# Altium schematic symbol library Capacitor - Aluminium TH.SchLib: 4591 symbols (part 15 of 27) (continued)
## UBX1H471MHL1TO (continued)
CAP ALUM 470UF 20% 50V RADIAL; Part Number: UBX1H471MHL1TO; Manufacturer: Nichicon; TemperatureRange: -55C ~ 150C; Type: Polar; Ripple Current: 960mA; Value: 470uF; PartId: 23783; Supplier 1: Digi-Key; Supplier Part Number 1: 493-13204-1-ND; ComponentLink1Description: Datasheet; ComponentLink1URL: http://nichicon-us.com/english/products/pdfs/e-ubx.pdf; ComponentLink2Description: Digi-Key Listing; ComponentLink2URL: https://www.digikey.com/product-detail/en/nichicon/UBX1H471MHL1TO/493-13204-1-ND/4333214; Tolerance: 20%; Voltage: 50V; Price: 3.25; Device Package: Radial, Can, 12.5mm
footprint CAP AL TH D12.5 L5 H26.5
pins: 1, 2

## UBX1J221MHL1TO
designator C?, comment 220uF  (value not drawn)
CAP ALUM 220UF 20% 63V RADIAL; Part Number: UBX1J221MHL1TO; Manufacturer: Nichicon; TemperatureRange: -55C ~ 150C; Type: Polar; Ripple Current: 520mA @ 120Hz; Value: 220uF; PartId: 23728; Supplier 1: Digi-Key; Supplier Part Number 1: 493-13207-3-ND; ComponentLink1Description: Datasheet; ComponentLink1URL: http://nichicon-us.com/english/products/pdfs/e-ubx.pdf; ComponentLink2Description: Digi-Key Listing; ComponentLink2URL: https://www.digikey.com/product-detail/en/nichicon/UBX1J221MHL1TO/493-13207-3-ND/4332838; Tolerance: 20%; Voltage: 63V; Price: 1.3638; Device Package: Radial, Can, 12.5mm
footprint CAP AL TH D12.5 L5 H26.5
pins: 1, 2

## UBX1J331MHL
designator C?, comment 330uF  (value not drawn)
CAP ALUM 330UF 20% 63V RADIAL; Part Number: UBX1J331MHL; Manufacturer: Nichicon; TemperatureRange: -55C ~ 150C; Type: Polar; Ripple Current: 585mA @ 120Hz; Value: 330uF; PartId: 24429; Supplier 1: Digi-Key; Supplier Part Number 1: 493-13055-ND; ComponentLink1Description: Datasheet; ComponentLink1URL: http://nichicon-us.com/english/products/pdfs/e-ubx.pdf; ComponentLink2Description: Digi-Key Listing; ComponentLink2URL: https://www.digikey.com/product-detail/en/nichicon/UBX1J331MHL/493-13055-ND/2597555; Tolerance: 20%; Voltage: 63V; Price: 3.04; Device Package: Radial, Can, 12.5mm
footprint CAP AL TH D12.5 L5 H35.5
pins: 1, 2

## UBX1J561MHL
designator C?, comment 560uF  (value not drawn)
CAP ALUM 560UF 20% 63V RADIAL; Part Number: UBX1J561MHL; Manufacturer: Nichicon; TemperatureRange: -55C ~ 150C; Type: Polar; Ripple Current: 760mA @ 120Hz; Value: 560uF; PartId: 27308; Supplier 1: Digi-Key; Supplier Part Number 1: 493-13056-ND; ComponentLink1Description: Datasheet; ComponentLink1URL: http://nichicon-us.com/english/products/pdfs/e-ubx.pdf; ComponentLink2Description: Digi-Key Listing; ComponentLink2URL: https://www.digikey.com/product-detail/en/nichicon/UBX1J561MHL/493-13056-ND/2597558; Tolerance: 20%; Voltage: 63V; Price: 4.24; Device Package: Radial, Can, 16mm
footprint CAP AL TH D16 L7.5 H33.5
pins: 1, 2

## UBX1J681MHL
designator C?, comment 680uF  (value not drawn)
CAP ALUM 680UF 20% 63V RADIAL; Part Number: UBX1J681MHL; Manufacturer: Nichicon; TemperatureRange: -55C ~ 150C; Type: Polar; Ripple Current: 760mA @ 120Hz; Value: 680uF; PartId: 27450; Supplier 1: Digi-Key; Supplier Part Number 1: 493-13057-ND; ComponentLink1Description: Datasheet; ComponentLink1URL: http://nichicon-us.com/english/products/pdfs/e-ubx.pdf; ComponentLink2Description: Digi-Key Listing; ComponentLink2URL: https://www.digikey.com/product-detail/en/nichicon/UBX1J681MHL/493-13057-ND/2597560; Tolerance: 20%; Voltage: 63V; Price: 4.45; Device Package: Radial, Can, 16mm
footprint CAP AL TH D16 L7.5 H37
pins: 1, 2

## UBX1K101MHL1TO
designator C?, comment 100uF  (value not drawn)
CAP ALUM 100UF 20% 80V RADIAL; Part Number: UBX1K101MHL1TO; Manufacturer: Nichicon; TemperatureRange: -55C ~ 150C; Type: Polar; Ripple Current: 820mA; Value: 100uF; PartId: 23086; Supplier 1: Digi-Key; Supplier Part Number 1: 493-13211-1-ND; ComponentLink1Description: Datasheet; ComponentLink1URL: http://nichicon-us.com/english/products/pdfs/e-ubx.pdf; ComponentLink2Description: Digi-Key Listing; ComponentLink2URL: https://www.digikey.com/product-detail/en/nichicon/UBX1K101MHL1TO/493-13211-1-ND/4333221; Tolerance: 20%; Voltage: 80V; Price: 0; Device Package: Radial, Can, 12.5mm
footprint CAP AL TH D12.5 L5 H21.5
pins: 1, 2

## UBX1K331MHL
designator C?, comment 330uF  (value not drawn)
CAP ALUM 330UF 20% 80V RADIAL; Part Number: UBX1K331MHL; Manufacturer: Nichicon; TemperatureRange: -55C ~ 150C; Type: Polar; Ripple Current: 740mA @ 120Hz; Value: 330uF; PartId: 27310; Supplier 1: Digi-Key; Supplier Part Number 1: 493-13058-ND; ComponentLink1Description: Datasheet; ComponentLink1URL: http://nichicon-us.com/english/products/pdfs/e-ubx.pdf; ComponentLink2Description: Digi-Key Listing; ComponentLink2URL: https://www.digikey.com/product-detail/en/nichicon/UBX1K331MHL/493-13058-ND/2597564; Tolerance: 20%; Voltage: 80V; Price: 4.32; Device Package: Radial, Can, 16mm
footprint CAP AL TH D16 L7.5 H33.5
pins: 1, 2

## UBX1V2R2MPL1TD
designator C?, comment 2.2uF  (value not drawn)
CAP ALUM 2.2UF 20% 35V RADIAL; Part Number: UBX1V2R2MPL1TD; Manufacturer: Nichicon; TemperatureRange: -55C ~ 150C; Type: Polar; Ripple Current: 25mA @ 120Hz; Value: 2.2uF; PartId: 24740; Supplier 1: Digi-Key; Supplier Part Number 1: 493-13222-3-ND; ComponentLink1Description: Datasheet; ComponentLink1URL: http://nichicon-us.com/english/products/pdfs/e-ubx.pdf; ComponentLink2Description: Digi-Key Listing; ComponentLink2URL: https://www.digikey.com/product-detail/en/nichicon/UBX1V2R2MPL1TD/493-13222-3-ND/4332853; Tolerance: 20%; Voltage: 35V; Price: 0.419; Device Package: Radial, Can, 10mm
footprint CAP AL TH D10 L5 H14.5
pins: 1, 2

## UBX1V101MPL1TD
designator C?, comment 100uF  (value not drawn)
CAP ALUM 100UF 20% 35V RADIAL; Part Number: UBX1V101MPL1TD; Manufacturer: Nichicon; TemperatureRange: -55C ~ 150C; Type: Polar; Ripple Current: 200mA @ 120Hz; Value: 100uF; PartId: 25502; Supplier 1: Digi-Key; Supplier Part Number 1: 493-13219-3-ND; ComponentLink1Description: Datasheet; ComponentLink1URL: http://nichicon-us.com/english/products/pdfs/e-ubx.pdf; ComponentLink2Description: Digi-Key Listing; ComponentLink2URL: https://www.digikey.com/product-detail/en/nichicon/UBX1V101MPL1TD/493-13219-3-ND/4332850; Tolerance: 20%; Voltage: 35V; Price: 0.4773; Device Package: Radial, Can, 10mm
footprint CAP AL TH D10 L5 H22
pins: 1, 2

## UBX1V220MPL1TD
designator C?, comment 22uF  (value not drawn)
CAP ALUM 22UF 20% 35V RADIAL; Part Number: UBX1V220MPL1TD; Manufacturer: Nichicon; TemperatureRange: -55C ~ 150C; Type: Polar; Ripple Current: 100mA @ 120Hz; Value: 22uF; PartId: 24741; Supplier 1: Digi-Key; Supplier Part Number 1: 493-13220-3-ND; ComponentLink1Description: Datasheet; ComponentLink1URL: http://nichicon-us.com/english/products/pdfs/e-ubx.pdf; ComponentLink2Description: Digi-Key Listing; ComponentLink2URL: https://www.digikey.com/product-detail/en/nichicon/UBX1V220MPL1TD/493-13220-3-ND/4332851; Tolerance: 20%; Voltage: 35V; Price: 0.419; Device Package: Radial, Can, 10mm
footprint CAP AL TH D10 L5 H14.5
pins: 1, 2

## UBX1V221MHL1TO
designator C?, comment 220uF  (value not drawn)
CAP ALUM 220UF 20% 35V RADIAL; Part Number: UBX1V221MHL1TO; Manufacturer: Nichicon; TemperatureRange: -55C ~ 150C; Type: Polar; Ripple Current: 600mA; Value: 220uF; PartId: 23761; Supplier 1: Digi-Key; Supplier Part Number 1: 493-13221-1-ND; ComponentLink1Description: Datasheet; ComponentLink1URL: http://nichicon-us.com/english/products/pdfs/e-ubx.pdf; ComponentLink2Description: Digi-Key Listing; ComponentLink2URL: https://www.digikey.com/product-detail/en/nichicon/UBX1V221MHL1TO/493-13221-1-ND/4333231; Tolerance: 20%; Voltage: 35V; Price: 1.77; Device Package: Radial, Can, 12.5mm
footprint CAP AL TH D12.5 L5 H26.5
pins: 1, 2

## UBX1V330MPL1TD
designator C?, comment 33uF  (value not drawn)
CAP ALUM 33UF 20% 35V RADIAL; Part Number: UBX1V330MPL1TD; Manufacturer: Nichicon; TemperatureRange: -55C ~ 150C; Type: Polar; Ripple Current: 112.5mA @ 120Hz; Value: 33uF; PartId: 24755; Supplier 1: Digi-Key; Supplier Part Number 1: 493-13223-3-ND; ComponentLink1Description: Datasheet; ComponentLink1URL: http://nichicon-us.com/english/products/pdfs/e-ubx.pdf; ComponentLink2Description: Digi-Key Listing; ComponentLink2URL: https://www.digikey.com/product-detail/en/nichicon/UBX1V330MPL1TD/493-13223-3-ND/4332854; Tolerance: 20%; Voltage: 35V; Price: 0.4244; Device Package: Radial, Can, 10mm
footprint CAP AL TH D10 L5 H14.5
pins: 1, 2

## UBX1V471MHL
designator C?, comment 470uF  (value not drawn)
CAP ALUM 470UF 20% 35V RADIAL; Part Number: UBX1V471MHL; Manufacturer: Nichicon; TemperatureRange: -55C ~ 150C; Type: Polar; Ripple Current: 500mA @ 120Hz; Value: 470uF; PartId: 27263; Supplier 1: Digi-Key; Supplier Part Number 1: 493-13061-ND; ComponentLink1Description: Datasheet; ComponentLink1URL: http://nichicon-us.com/english/products/pdfs/e-ubx.pdf; ComponentLink2Description: Digi-Key Listing; ComponentLink2URL: https://www.digikey.com/product-detail/en/nichicon/UBX1V471MHL/493-13061-ND/2597580; Tolerance: 20%; Voltage: 35V; Price: 2.86; Device Package: Radial, Can, 16mm
footprint CAP AL TH D16 L7.5 H33.5
pins: 1, 2

## UBX2A101MHL1TO
designator C?, comment 100uF  (value not drawn)
CAP ALUM 100UF 20% 100V RADIAL; Part Number: UBX2A101MHL1TO; Manufacturer: Nichicon; TemperatureRange: -55C ~ 150C; Type: Polar; Ripple Current: 475mA @ 120Hz; Value: 100uF; PartId: 23731; Supplier 1: Digi-Key; Supplier Part Number 1: 493-13228-3-ND; ComponentLink1Description: Datasheet; ComponentLink1URL: http://nichicon-us.com/english/products/pdfs/e-ubx.pdf; ComponentLink2Description: Digi-Key Listing; ComponentLink2URL: https://www.digikey.com/product-detail/en/nichicon/UBX2A101MHL1TO/493-13228-3-ND/4332859; Tolerance: 20%; Voltage: 100V; Price: 1.4289; Device Package: Radial, Can, 12.5mm
footprint CAP AL TH D12.5 L5 H26.5
pins: 1, 2

## UBX2A221MHL
designator C?, comment 220uF  (value not drawn)
CAP ALUM 220UF 20% 100V RADIAL; Part Number: UBX2A221MHL; Manufacturer: Nichicon; TemperatureRange: -55C ~ 150C; Type: Polar; Ripple Current: 690mA @ 120Hz; Value: 220uF; PartId: 27309; Supplier 1: Digi-Key; Supplier Part Number 1: 493-13062-ND; ComponentLink1Description: Datasheet; ComponentLink1URL: http://nichicon-us.com/english/products/pdfs/e-ubx.pdf; ComponentLink2Description: Digi-Key Listing; ComponentLink2URL: https://www.digikey.com/product-detail/en/nichicon/UBX2A221MHL/493-13062-ND/2597584; Tolerance: 20%; Voltage: 100V; Price: 4.32; Device Package: Radial, Can, 16mm
footprint CAP AL TH D16 L7.5 H33.5
pins: 1, 2

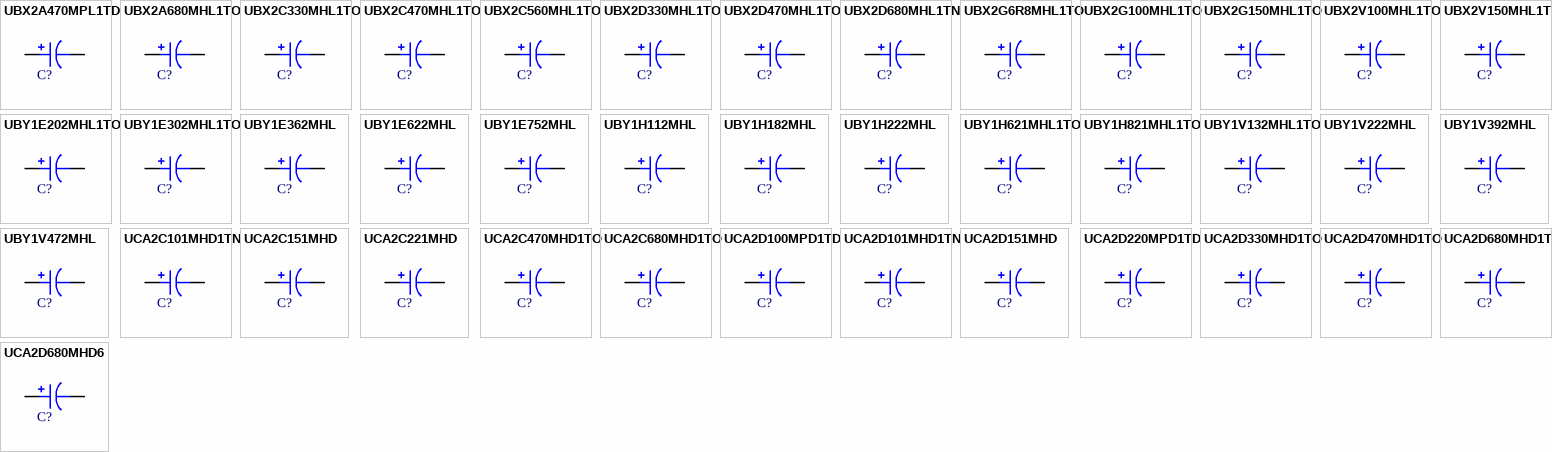
[diagram p61: symbols UBX2A470MPL1TD to UCA2D680MHD6]

## UBX2A470MPL1TD
designator C?, comment 47uF  (value not drawn)
CAP ALUM 47UF 20% 100V RADIAL; Part Number: UBX2A470MPL1TD; Manufacturer: Nichicon; TemperatureRange: -55C ~ 150C; Type: Polar; Ripple Current: 320mA @ 120Hz; Value: 47uF; PartId: 25688; Supplier 1: Digi-Key; Supplier Part Number 1: 493-13096-3-ND; ComponentLink1Description: Datasheet; ComponentLink1URL: http://nichicon-us.com/english/products/pdfs/e-ubx.pdf; ComponentLink2Description: Digi-Key Listing; ComponentLink2URL: https://www.digikey.com/product-detail/en/nichicon/UBX2A470MPL1TD/493-13096-3-ND/4332727; Tolerance: 20%; Voltage: 100V; Price: 0.802; Device Package: Radial, Can, 10mm
footprint CAP AL TH D10 L5 H22
pins: 1, 2

## UBX2A680MHL1TO
designator C?, comment 68uF  (value not drawn)
CAP ALUM 68UF 20% 100V RADIAL; Part Number: UBX2A680MHL1TO; Manufacturer: Nichicon; TemperatureRange: -55C ~ 150C; Type: Polar; Ripple Current: 760mA; Value: 68uF; PartId: 23085; Supplier 1: Digi-Key; Supplier Part Number 1: 493-13232-1-ND; ComponentLink1Description: Datasheet; ComponentLink1URL: http://nichicon-us.com/english/products/pdfs/e-ubx.pdf; ComponentLink2Description: Digi-Key Listing; ComponentLink2URL: https://www.digikey.com/product-detail/en/nichicon/UBX2A680MHL1TO/493-13232-1-ND/4333242; Tolerance: 20%; Voltage: 100V; Price: 0; Device Package: Radial, Can, 12.5mm
footprint CAP AL TH D12.5 L5 H21.5
pins: 1, 2

## UBX2C330MHL1TO
designator C?, comment 33uF  (value not drawn)
CAP ALUM 33UF 20% 160V RADIAL; Part Number: UBX2C330MHL1TO; Manufacturer: Nichicon; TemperatureRange: -40C ~ 150C; Type: Polar; Ripple Current: 230mA; Value: 33uF; PartId: 23077; Supplier 1: Digi-Key; Supplier Part Number 1: 493-13237-1-ND; ComponentLink1Description: Datasheet; ComponentLink1URL: http://nichicon-us.com/english/products/pdfs/e-ubx.pdf; ComponentLink2Description: Digi-Key Listing; ComponentLink2URL: https://www.digikey.com/product-detail/en/nichicon/UBX2C330MHL1TO/493-13237-1-ND/4333247; Tolerance: 20%; Voltage: 160V; Price: 0; Device Package: Radial, Can, 12.5mm
footprint CAP AL TH D12.5 L5 H21.5
pins: 1, 2

## UBX2C470MHL1TO
designator C?, comment 47uF  (value not drawn)
CAP ALUM 47UF 20% 160V RADIAL; Part Number: UBX2C470MHL1TO; Manufacturer: Nichicon; TemperatureRange: -40C ~ 150C; Type: Polar; Ripple Current: 250mA; Value: 47uF; PartId: 23083; Supplier 1: Digi-Key; Supplier Part Number 1: 493-13238-1-ND; ComponentLink1Description: Datasheet; ComponentLink1URL: http://nichicon-us.com/english/products/pdfs/e-ubx.pdf; ComponentLink2Description: Digi-Key Listing; ComponentLink2URL: https://www.digikey.com/product-detail/en/nichicon/UBX2C470MHL1TO/493-13238-1-ND/4333248; Tolerance: 20%; Voltage: 160V; Price: 0; Device Package: Radial, Can, 12.5mm
footprint CAP AL TH D12.5 L5 H21.5
pins: 1, 2

## UBX2C560MHL1TO
designator C?, comment 56uF  (value not drawn)
CAP ALUM 56UF 20% 160V RADIAL; Part Number: UBX2C560MHL1TO; Manufacturer: Nichicon; TemperatureRange: -40C ~ 150C; Type: Polar; Ripple Current: 270mA; Value: 56uF; PartId: 23784; Supplier 1: Digi-Key; Supplier Part Number 1: 493-13239-1-ND; ComponentLink1Description: Datasheet; ComponentLink1URL: http://nichicon-us.com/english/products/pdfs/e-ubx.pdf; ComponentLink2Description: Digi-Key Listing; ComponentLink2URL: https://www.digikey.com/product-detail/en/nichicon/UBX2C560MHL1TO/493-13239-1-ND/4333249; Tolerance: 20%; Voltage: 160V; Price: 3.31; Device Package: Radial, Can, 12.5mm
footprint CAP AL TH D12.5 L5 H26.5
pins: 1, 2

## UBX2D330MHL1TO
designator C?, comment 33uF  (value not drawn)
CAP ALUM 33UF 20% 200V RADIAL; Part Number: UBX2D330MHL1TO; Manufacturer: Nichicon; TemperatureRange: -40C ~ 150C; Type: Polar; Ripple Current: 210mA; Value: 33uF; PartId: 23082; Supplier 1: Digi-Key; Supplier Part Number 1: 493-13244-1-ND; ComponentLink1Description: Datasheet; ComponentLink1URL: http://nichicon-us.com/english/products/pdfs/e-ubx.pdf; ComponentLink2Description: Digi-Key Listing; ComponentLink2URL: https://www.digikey.com/product-detail/en/nichicon/UBX2D330MHL1TO/493-13244-1-ND/4333254; Tolerance: 20%; Voltage: 200V; Price: 0; Device Package: Radial, Can, 12.5mm
footprint CAP AL TH D12.5 L5 H21.5
pins: 1, 2

## UBX2D470MHL1TO
designator C?, comment 47uF  (value not drawn)
CAP ALUM 47UF 20% 200V RADIAL; Part Number: UBX2D470MHL1TO; Manufacturer: Nichicon; TemperatureRange: -40C ~ 150C; Type: Polar; Ripple Current: 250mA; Value: 47uF; PartId: 23785; Supplier 1: Digi-Key; Supplier Part Number 1: 493-13245-1-ND; ComponentLink1Description: Datasheet; ComponentLink1URL: http://nichicon-us.com/english/products/pdfs/e-ubx.pdf; ComponentLink2Description: Digi-Key Listing; ComponentLink2URL: https://www.digikey.com/product-detail/en/nichicon/UBX2D470MHL1TO/493-13245-1-ND/4333255; Tolerance: 20%; Voltage: 200V; Price: 3.31; Device Package: Radial, Can, 12.5mm
footprint CAP AL TH D12.5 L5 H26.5
pins: 1, 2

## UBX2D680MHL1TN
designator C?, comment 68uF  (value not drawn)
CAP ALUM 68UF 20% 200V RADIAL; Part Number: UBX2D680MHL1TN; Manufacturer: Nichicon; TemperatureRange: -40C ~ 150C; Type: Polar; Ripple Current: 290mA @ 120Hz; Value: 68uF; PartId: 26711; Supplier 1: Digi-Key; Supplier Part Number 1: 493-13247-3-ND; ComponentLink1Description: Datasheet; ComponentLink1URL: http://nichicon-us.com/english/products/pdfs/e-ubx.pdf; ComponentLink2Description: Digi-Key Listing; ComponentLink2URL: https://www.digikey.com/product-detail/en/nichicon/UBX2D680MHL1TN/493-13247-3-ND/4332878; Tolerance: 20%; Voltage: 200V; Price: 2.3548; Device Package: Radial, Can, 16mm
footprint CAP AL TH D16 L7.5 H26.5
pins: 1, 2

## UBX2G6R8MHL1TO
designator C?, comment 6.8uF  (value not drawn)
CAP ALUM 6.8UF 20% 400V RADIAL; Part Number: UBX2G6R8MHL1TO; Manufacturer: Nichicon; TemperatureRange: -25C ~ 150C; Type: Polar; Ripple Current: 88mA; Value: 6.8uF; PartId: 23078; Supplier 1: Digi-Key; Supplier Part Number 1: 493-13252-1-ND; ComponentLink1Description: Datasheet; ComponentLink1URL: http://nichicon-us.com/english/products/pdfs/e-ubx.pdf; ComponentLink2Description: Digi-Key Listing; ComponentLink2URL: https://www.digikey.com/product-detail/en/nichicon/UBX2G6R8MHL1TO/493-13252-1-ND/4333262; Tolerance: 20%; Voltage: 400V; Price: 0; Device Package: Radial, Can, 12.5mm
footprint CAP AL TH D12.5 L5 H21.5
pins: 1, 2

## UBX2G100MHL1TO
designator C?, comment 10uF  (value not drawn)
CAP ALUM 10UF 20% 400V RADIAL; Part Number: UBX2G100MHL1TO; Manufacturer: Nichicon; TemperatureRange: -25C ~ 150C; Type: Polar; Ripple Current: 105mA; Value: 10uF; PartId: 23779; Supplier 1: Digi-Key; Supplier Part Number 1: 493-13249-1-ND; ComponentLink1Description: Datasheet; ComponentLink1URL: http://nichicon-us.com/english/products/pdfs/e-ubx.pdf; ComponentLink2Description: Digi-Key Listing; ComponentLink2URL: https://www.digikey.com/product-detail/en/nichicon/UBX2G100MHL1TO/493-13249-1-ND/4333259; Tolerance: 20%; Voltage: 400V; Price: 2.58; Device Package: Radial, Can, 12.5mm
footprint CAP AL TH D12.5 L5 H26.5
pins: 1, 2

## UBX2G150MHL1TO
designator C?, comment 15uF  (value not drawn)
CAP ALUM 15UF 20% 400V RADIAL; Part Number: UBX2G150MHL1TO; Manufacturer: Nichicon; TemperatureRange: -25C ~ 150C; Type: Polar; Ripple Current: 105mA; Value: 15uF; PartId: 23778; Supplier 1: Digi-Key; Supplier Part Number 1: 493-13250-1-ND; ComponentLink1Description: Datasheet; ComponentLink1URL: http://nichicon-us.com/english/products/pdfs/e-ubx.pdf; ComponentLink2Description: Digi-Key Listing; ComponentLink2URL: https://www.digikey.com/product-detail/en/nichicon/UBX2G150MHL1TO/493-13250-1-ND/4333260; Tolerance: 20%; Voltage: 400V; Price: 2.58; Device Package: Radial, Can, 12.5mm
footprint CAP AL TH D12.5 L5 H26.5
pins: 1, 2

## UBX2V100MHL1TO
designator C?, comment 10uF  (value not drawn)
CAP ALUM 10UF 20% 350V RADIAL; Part Number: UBX2V100MHL1TO; Manufacturer: Nichicon; TemperatureRange: -25C ~ 150C; Type: Polar; Ripple Current: 120mA; Value: 10uF; PartId: 23081; Supplier 1: Digi-Key; Supplier Part Number 1: 493-13253-1-ND; ComponentLink1Description: Datasheet; ComponentLink1URL: http://nichicon-us.com/english/products/pdfs/e-ubx.pdf; ComponentLink2Description: Digi-Key Listing; ComponentLink2URL: https://www.digikey.com/product-detail/en/nichicon/UBX2V100MHL1TO/493-13253-1-ND/4333263; Tolerance: 20%; Voltage: 350V; Price: 0; Device Package: Radial, Can, 12.5mm
footprint CAP AL TH D12.5 L5 H21.5
pins: 1, 2

## UBX2V150MHL1TO
designator C?, comment 15uF  (value not drawn)
CAP ALUM 15UF 20% 350V RADIAL; Part Number: UBX2V150MHL1TO; Manufacturer: Nichicon; TemperatureRange: -25C ~ 150C; Type: Polar; Ripple Current: 130mA; Value: 15uF; PartId: 23777; Supplier 1: Digi-Key; Supplier Part Number 1: 493-13254-1-ND; ComponentLink1Description: Datasheet; ComponentLink1URL: http://nichicon-us.com/english/products/pdfs/e-ubx.pdf; ComponentLink2Description: Digi-Key Listing; ComponentLink2URL: https://www.digikey.com/product-detail/en/nichicon/UBX2V150MHL1TO/493-13254-1-ND/4333264; Tolerance: 20%; Voltage: 350V; Price: 2.58; Device Package: Radial, Can, 12.5mm
footprint CAP AL TH D12.5 L5 H26.5
pins: 1, 2

## UBY1E202MHL1TO
designator C?, comment 2000uF  (value not drawn)
CAP ALUM 2000UF 20% 25V RADIAL; Part Number: UBY1E202MHL1TO; Manufacturer: Nichicon; TemperatureRange: -40C ~ 135C; Type: Polar; Ripple Current: 1.014A @ 120Hz; Value: 2000uF; PartId: 23079; Supplier 1: Digi-Key; Supplier Part Number 1: 493-14650-1-ND; ComponentLink1Description: Datasheet; ComponentLink1URL: http://nichicon-us.com/english/products/pdfs/UBY_e.pdf; ComponentLink2Description: Digi-Key Listing; ComponentLink2URL: https://www.digikey.com/product-detail/en/nichicon/UBY1E202MHL1TO/493-14650-1-ND/5818417; Tolerance: 20%; Voltage: 25V; Price: 0; Device Package: Radial, Can, 12.5mm
footprint CAP AL TH D12.5 L5 H21.5
pins: 1, 2

## UBY1E302MHL1TO
designator C?, comment 3000uF  (value not drawn)
CAP ALUM 3000UF 20% 25V RADIAL; Part Number: UBY1E302MHL1TO; Manufacturer: Nichicon; TemperatureRange: -40C ~ 135C; Type: Polar; Ripple Current: 1.508A @ 120Hz; Value: 3000uF; PartId: 23780; Supplier 1: Digi-Key; Supplier Part Number 1: 493-14651-1-ND; ComponentLink1Description: Datasheet; ComponentLink1URL: http://nichicon-us.com/english/products/pdfs/UBY_e.pdf; ComponentLink2Description: Digi-Key Listing; ComponentLink2URL: https://www.digikey.com/product-detail/en/nichicon/UBY1E302MHL1TO/493-14651-1-ND/5818418; Tolerance: 20%; Voltage: 25V; Price: 3.06; Device Package: Radial, Can, 12.5mm
footprint CAP AL TH D12.5 L5 H26.5
pins: 1, 2

## UBY1E362MHL
designator C?, comment 3600uF  (value not drawn)
CAP ALUM 3600UF 20% 25V RADIAL; Part Number: UBY1E362MHL; Manufacturer: Nichicon; TemperatureRange: -40C ~ 135C; Type: Polar; Ripple Current: 2.175A @ 120Hz; Value: 3600uF; PartId: 24431; Supplier 1: Digi-Key; Supplier Part Number 1: 493-14624-ND; ComponentLink1Description: Datasheet; ComponentLink1URL: http://nichicon-us.com/english/products/pdfs/UBY_e.pdf; ComponentLink2Description: Digi-Key Listing; ComponentLink2URL: https://www.digikey.com/product-detail/en/nichicon/UBY1E362MHL/493-14624-ND/5818373; Tolerance: 20%; Voltage: 25V; Price: 3.23; Device Package: Radial, Can, 12.5mm
footprint CAP AL TH D12.5 L5 H35.5
pins: 1, 2

## UBY1E622MHL
designator C?, comment 6200uF  (value not drawn)
CAP ALUM 6200UF 20% 25V RADIAL; Part Number: UBY1E622MHL; Manufacturer: Nichicon; TemperatureRange: -40C ~ 135C; Type: Polar; Ripple Current: 2.89A @ 120Hz; Value: 6200uF; PartId: 27305; Supplier 1: Digi-Key; Supplier Part Number 1: 493-14626-ND; ComponentLink1Description: Datasheet; ComponentLink1URL: http://nichicon-us.com/english/products/pdfs/UBY_e.pdf; ComponentLink2Description: Digi-Key Listing; ComponentLink2URL: https://www.digikey.com/product-detail/en/nichicon/UBY1E622MHL/493-14626-ND/5818375; Tolerance: 20%; Voltage: 25V; Price: 3.96; Device Package: Radial, Can, 16mm
footprint CAP AL TH D16 L7.5 H33.5
pins: 1, 2

## UBY1E752MHL
designator C?, comment 7500uF  (value not drawn)
CAP ALUM 7500UF 20% 25V RADIAL; Part Number: UBY1E752MHL; Manufacturer: Nichicon; TemperatureRange: -40C ~ 135C; Type: Polar; Ripple Current: 3.086A @ 120Hz; Value: 7500uF; PartId: 27453; Supplier 1: Digi-Key; Supplier Part Number 1: 493-14627-ND; ComponentLink1Description: Datasheet; ComponentLink1URL: http://nichicon-us.com/english/products/pdfs/UBY_e.pdf; ComponentLink2Description: Digi-Key Listing; ComponentLink2URL: https://www.digikey.com/product-detail/en/nichicon/UBY1E752MHL/493-14627-ND/5818376; Tolerance: 20%; Voltage: 25V; Price: 4.69; Device Package: Radial, Can, 16mm
footprint CAP AL TH D16 L7.5 H37
pins: 1, 2

## UBY1H112MHL
designator C?, comment 1100uF  (value not drawn)
CAP ALUM 1100UF 20% 50V RADIAL; Part Number: UBY1H112MHL; Manufacturer: Nichicon; TemperatureRange: -40C ~ 135C; Type: Polar; Ripple Current: 1.512A @ 120Hz; Value: 1100uF; PartId: 24428; Supplier 1: Digi-Key; Supplier Part Number 1: 493-14641-ND; ComponentLink1Description: Datasheet; ComponentLink1URL: http://nichicon-us.com/english/products/pdfs/UBY_e.pdf; ComponentLink2Description: Digi-Key Listing; ComponentLink2URL: https://www.digikey.com/product-detail/en/nichicon/UBY1H112MHL/493-14641-ND/5818390; Tolerance: 20%; Voltage: 50V; Price: 2.9; Device Package: Radial, Can, 12.5mm
footprint CAP AL TH D12.5 L5 H35.5
pins: 1, 2

## UBY1H182MHL
designator C?, comment 1800uF  (value not drawn)
CAP ALUM 1800UF 20% 50V RADIAL; Part Number: UBY1H182MHL; Manufacturer: Nichicon; TemperatureRange: -40C ~ 135C; Type: Polar; Ripple Current: 1.776A @ 120Hz; Value: 1800uF; PartId: 27304; Supplier 1: Digi-Key; Supplier Part Number 1: 493-14644-ND; ComponentLink1Description: Datasheet; ComponentLink1URL: http://nichicon-us.com/english/products/pdfs/UBY_e.pdf; ComponentLink2Description: Digi-Key Listing; ComponentLink2URL: https://www.digikey.com/product-detail/en/nichicon/UBY1H182MHL/493-14644-ND/5818393; Tolerance: 20%; Voltage: 50V; Price: 3.91; Device Package: Radial, Can, 16mm
footprint CAP AL TH D16 L7.5 H33.5
pins: 1, 2

## UBY1H222MHL
designator C?, comment 2200uF  (value not drawn)
CAP ALUM 2200UF 20% 50V RADIAL; Part Number: UBY1H222MHL; Manufacturer: Nichicon; TemperatureRange: -40C ~ 135C; Type: Polar; Ripple Current: 2.37A @ 120Hz; Value: 2200uF; PartId: 27452; Supplier 1: Digi-Key; Supplier Part Number 1: 493-14645-ND; ComponentLink1Description: Datasheet; ComponentLink1URL: http://nichicon-us.com/english/products/pdfs/UBY_e.pdf; ComponentLink2Description: Digi-Key Listing; ComponentLink2URL: https://www.digikey.com/product-detail/en/nichicon/UBY1H222MHL/493-14645-ND/5818394; Tolerance: 20%; Voltage: 50V; Price: 4.55; Device Package: Radial, Can, 16mm
footprint CAP AL TH D16 L7.5 H37
pins: 1, 2

## UBY1H621MHL1TO
designator C?, comment 620uF  (value not drawn)
CAP ALUM 620UF 20% 50V RADIAL; Part Number: UBY1H621MHL1TO; Manufacturer: Nichicon; TemperatureRange: -40C ~ 135C; Type: Polar; Ripple Current: 882mA @ 120Hz; Value: 620uF; PartId: 23076; Supplier 1: Digi-Key; Supplier Part Number 1: 493-14662-1-ND; ComponentLink1Description: Datasheet; ComponentLink1URL: http://nichicon-us.com/english/products/pdfs/UBY_e.pdf; ComponentLink2Description: Digi-Key Listing; ComponentLink2URL: https://www.digikey.com/product-detail/en/nichicon/UBY1H621MHL1TO/493-14662-1-ND/5818429; Tolerance: 20%; Voltage: 50V; Price: 0; Device Package: Radial, Can, 12.5mm
footprint CAP AL TH D12.5 L5 H21.5
pins: 1, 2

## UBY1H821MHL1TO
designator C?, comment 820uF  (value not drawn)
CAP ALUM 820UF 20% 50V RADIAL; Part Number: UBY1H821MHL1TO; Manufacturer: Nichicon; TemperatureRange: -40C ~ 135C; Type: Polar; Ripple Current: 1.356A @ 120Hz; Value: 820uF; PartId: 23776; Supplier 1: Digi-Key; Supplier Part Number 1: 493-14663-1-ND; ComponentLink1Description: Datasheet; ComponentLink1URL: http://nichicon-us.com/english/products/pdfs/UBY_e.pdf; ComponentLink2Description: Digi-Key Listing; ComponentLink2URL: https://www.digikey.com/product-detail/en/nichicon/UBY1H821MHL1TO/493-14663-1-ND/5818430; Tolerance: 20%; Voltage: 50V; Price: 2.52; Device Package: Radial, Can, 12.5mm
footprint CAP AL TH D12.5 L5 H26.5
pins: 1, 2

## UBY1V132MHL1TO
designator C?, comment 1300uF  (value not drawn)
CAP ALUM 1300UF 20% 35V RADIAL; Part Number: UBY1V132MHL1TO; Manufacturer: Nichicon; TemperatureRange: -40C ~ 135C; Type: Polar; Ripple Current: 1.014A @ 120Hz; Value: 1300uF; PartId: 23080; Supplier 1: Digi-Key; Supplier Part Number 1: 493-14656-1-ND; ComponentLink1Description: Datasheet; ComponentLink1URL: http://nichicon-us.com/english/products/pdfs/UBY_e.pdf; ComponentLink2Description: Digi-Key Listing; ComponentLink2URL: https://www.digikey.com/product-detail/en/nichicon/UBY1V132MHL1TO/493-14656-1-ND/5818423; Tolerance: 20%; Voltage: 35V; Price: 0; Device Package: Radial, Can, 12.5mm
footprint CAP AL TH D12.5 L5 H21.5
pins: 1, 2

## UBY1V222MHL
designator C?, comment 2200uF  (value not drawn)
CAP ALUM 2200UF 20% 35V RADIAL; Part Number: UBY1V222MHL; Manufacturer: Nichicon; TemperatureRange: -40C ~ 135C; Type: Polar; Ripple Current: 2.175A @ 120Hz; Value: 2200uF; PartId: 24430; Supplier 1: Digi-Key; Supplier Part Number 1: 493-14632-ND; ComponentLink1Description: Datasheet; ComponentLink1URL: http://nichicon-us.com/english/products/pdfs/UBY_e.pdf; ComponentLink2Description: Digi-Key Listing; ComponentLink2URL: https://www.digikey.com/product-detail/en/nichicon/UBY1V222MHL/493-14632-ND/5818381; Tolerance: 20%; Voltage: 35V; Price: 3.11; Device Package: Radial, Can, 12.5mm
footprint CAP AL TH D12.5 L5 H35.5
pins: 1, 2

## UBY1V392MHL
designator C?, comment 3900uF  (value not drawn)
CAP ALUM 3900UF 20% 35V RADIAL; Part Number: UBY1V392MHL; Manufacturer: Nichicon; TemperatureRange: -40C ~ 135C; Type: Polar; Ripple Current: 2.55A @ 120Hz; Value: 3900uF; PartId: 27307; Supplier 1: Digi-Key; Supplier Part Number 1: 493-14635-ND; ComponentLink1Description: Datasheet; ComponentLink1URL: http://nichicon-us.com/english/products/pdfs/UBY_e.pdf; ComponentLink2Description: Digi-Key Listing; ComponentLink2URL: https://www.digikey.com/product-detail/en/nichicon/UBY1V392MHL/493-14635-ND/5818384; Tolerance: 20%; Voltage: 35V; Price: 4.08; Device Package: Radial, Can, 16mm
footprint CAP AL TH D16 L7.5 H33.5
pins: 1, 2

## UBY1V472MHL
designator C?, comment 4700uF  (value not drawn)
CAP ALUM 4700UF 20% 35V RADIAL; Part Number: UBY1V472MHL; Manufacturer: Nichicon; TemperatureRange: -40C ~ 135C; Type: Polar; Ripple Current: 3.086A @ 120Hz; Value: 4700uF; PartId: 27454; Supplier 1: Digi-Key; Supplier Part Number 1: 493-14636-ND; ComponentLink1Description: Datasheet; ComponentLink1URL: http://nichicon-us.com/english/products/pdfs/UBY_e.pdf; ComponentLink2Description: Digi-Key Listing; ComponentLink2URL: https://www.digikey.com/product-detail/en/nichicon/UBY1V472MHL/493-14636-ND/5818385; Tolerance: 20%; Voltage: 35V; Price: 4.76; Device Package: Radial, Can, 16mm
footprint CAP AL TH D16 L7.5 H37
pins: 1, 2

## UCA2C101MHD1TN
designator C?, comment 100uF  (value not drawn)
CAP ALUM 100UF 20% 160V RADIAL; Part Number: UCA2C101MHD1TN; Manufacturer: Nichicon; TemperatureRange: -25C ~ 105C; Type: Polar; Ripple Current: 640mA @ 120Hz; Value: 100uF; PartId: 26521; Supplier 1: Digi-Key; Supplier Part Number 1: 493-4757-3-ND; ComponentLink1Description: Datasheet; ComponentLink1URL: http://nichicon-us.com/english/products/pdfs/e-uca.pdf; ComponentLink2Description: Digi-Key Listing; ComponentLink2URL: https://www.digikey.com/product-detail/en/nichicon/UCA2C101MHD1TN/493-4757-3-ND/3129770; Tolerance: 20%; Voltage: 160V; Price: 0.643; Device Package: Radial, Can, 16mm
footprint CAP AL TH D16 L7.5 H26.5
pins: 1, 2

## UCA2C151MHD
designator C?, comment 150uF  (value not drawn)
CAP ALUM 150UF 20% 160V RADIAL; Part Number: UCA2C151MHD; Manufacturer: Nichicon; TemperatureRange: -25C ~ 105C; Type: Polar; Ripple Current: 680mA @ 120Hz; Value: 150uF; PartId: 27046; Supplier 1: Digi-Key; Supplier Part Number 1: 493-5441-ND; ComponentLink1Description: Datasheet; ComponentLink1URL: http://nichicon-us.com/english/products/pdfs/e-uca.pdf; ComponentLink2Description: Digi-Key Listing; ComponentLink2URL: https://www.digikey.com/product-detail/en/nichicon/UCA2C151MHD/493-5441-ND/2597616; Tolerance: 20%; Voltage: 160V; Price: 1.55; Device Package: Radial, Can, 16mm
footprint CAP AL TH D16 L7.5 H33.5
pins: 1, 2

## UCA2C221MHD
designator C?, comment 220uF  (value not drawn)
CAP ALUM 220UF 20% 160V RADIAL; Part Number: UCA2C221MHD; Manufacturer: Nichicon; TemperatureRange: -25C ~ 105C; Type: Polar; Ripple Current: 700mA @ 120Hz; Value: 220uF; PartId: 27050; Supplier 1: Digi-Key; Supplier Part Number 1: 493-13064-ND; ComponentLink1Description: Datasheet; ComponentLink1URL: http://nichicon-us.com/english/products/pdfs/e-uca.pdf; ComponentLink2Description: Digi-Key Listing; ComponentLink2URL: https://www.digikey.com/product-detail/en/nichicon/UCA2C221MHD/493-13064-ND/2597619; Tolerance: 20%; Voltage: 160V; Price: 1.56; Device Package: Radial, Can, 16mm
footprint CAP AL TH D16 L7.5 H33.5
pins: 1, 2

## UCA2C470MHD1TO
designator C?, comment 47uF  (value not drawn)
CAP ALUM 47UF 20% 160V RADIAL; Part Number: UCA2C470MHD1TO; Manufacturer: Nichicon; TemperatureRange: -25C ~ 105C; Ripple Current: 725mA; Value: 47uF; PartId: 23008; Supplier 1: Digi-Key; Supplier Part Number 1: 493-13260-1-ND; ComponentLink1Description: Datasheet; ComponentLink1URL: http://nichicon-us.com/english/products/pdfs/e-uca.pdf; ComponentLink2Description: Digi-Key Listing; ComponentLink2URL: https://www.digikey.com/product-detail/en/nichicon/UCA2C470MHD1TO/493-13260-1-ND/4333003; Tolerance: 20%; Voltage: 160V; Price: 0; Device Package: Radial, Can, 12.5mm
footprint CAP AL TH D12.5 L5 H21.5
pins: 1, 2

## UCA2C680MHD1TO
designator C?, comment 68uF  (value not drawn)
CAP ALUM 68UF 20% 160V RADIAL; Part Number: UCA2C680MHD1TO; Manufacturer: Nichicon; TemperatureRange: -25C ~ 105C; Type: Polar; Ripple Current: 475mA @ 120Hz; Value: 68uF; PartId: 23632; Supplier 1: Digi-Key; Supplier Part Number 1: 493-4760-3-ND; ComponentLink1Description: Datasheet; ComponentLink1URL: http://nichicon-us.com/english/products/pdfs/e-uca.pdf; ComponentLink2Description: Digi-Key Listing; ComponentLink2URL: https://www.digikey.com/product-detail/en/nichicon/UCA2C680MHD1TO/493-4760-3-ND/3129772; Tolerance: 20%; Voltage: 160V; Price: 0.4678; Device Package: Radial, Can, 12.5mm
footprint CAP AL TH D12.5 L5 H26.5
pins: 1, 2

## UCA2D100MPD1TD
designator C?, comment 10uF  (value not drawn)
CAP ALUM 10UF 20% 200V RADIAL; Part Number: UCA2D100MPD1TD; Manufacturer: Nichicon; TemperatureRange: -25C ~ 105C; Type: Polar; Ripple Current: 125mA @ 120Hz; Value: 10uF; PartId: 25101; Supplier 1: Digi-Key; Supplier Part Number 1: 493-4762-3-ND; ComponentLink1Description: Datasheet; ComponentLink1URL: http://nichicon-us.com/english/products/pdfs/e-uca.pdf; ComponentLink2Description: Digi-Key Listing; ComponentLink2URL: https://www.digikey.com/product-detail/en/nichicon/UCA2D100MPD1TD/493-4762-3-ND/3129773; Tolerance: 20%; Voltage: 200V; Price: 0.2871; Device Package: Radial, Can, 10mm
footprint CAP AL TH D10 L5 H17.5
pins: 1, 2

## UCA2D101MHD1TN
designator C?, comment 100uF  (value not drawn)